# Altium footprint library THU VIEN V1.PcbLib: 400 footprints (part 25 of 25)
Each footprint in its own frame and in the unit in brackets; x right, y up, seen from the top. Pads: shape width x height; smd on the part's side, far side on the other; paste and mask are expansions set on the pad; w line width, h text height; cw(c..) or ccw(c..) is an arc to the next point about the centre after c.
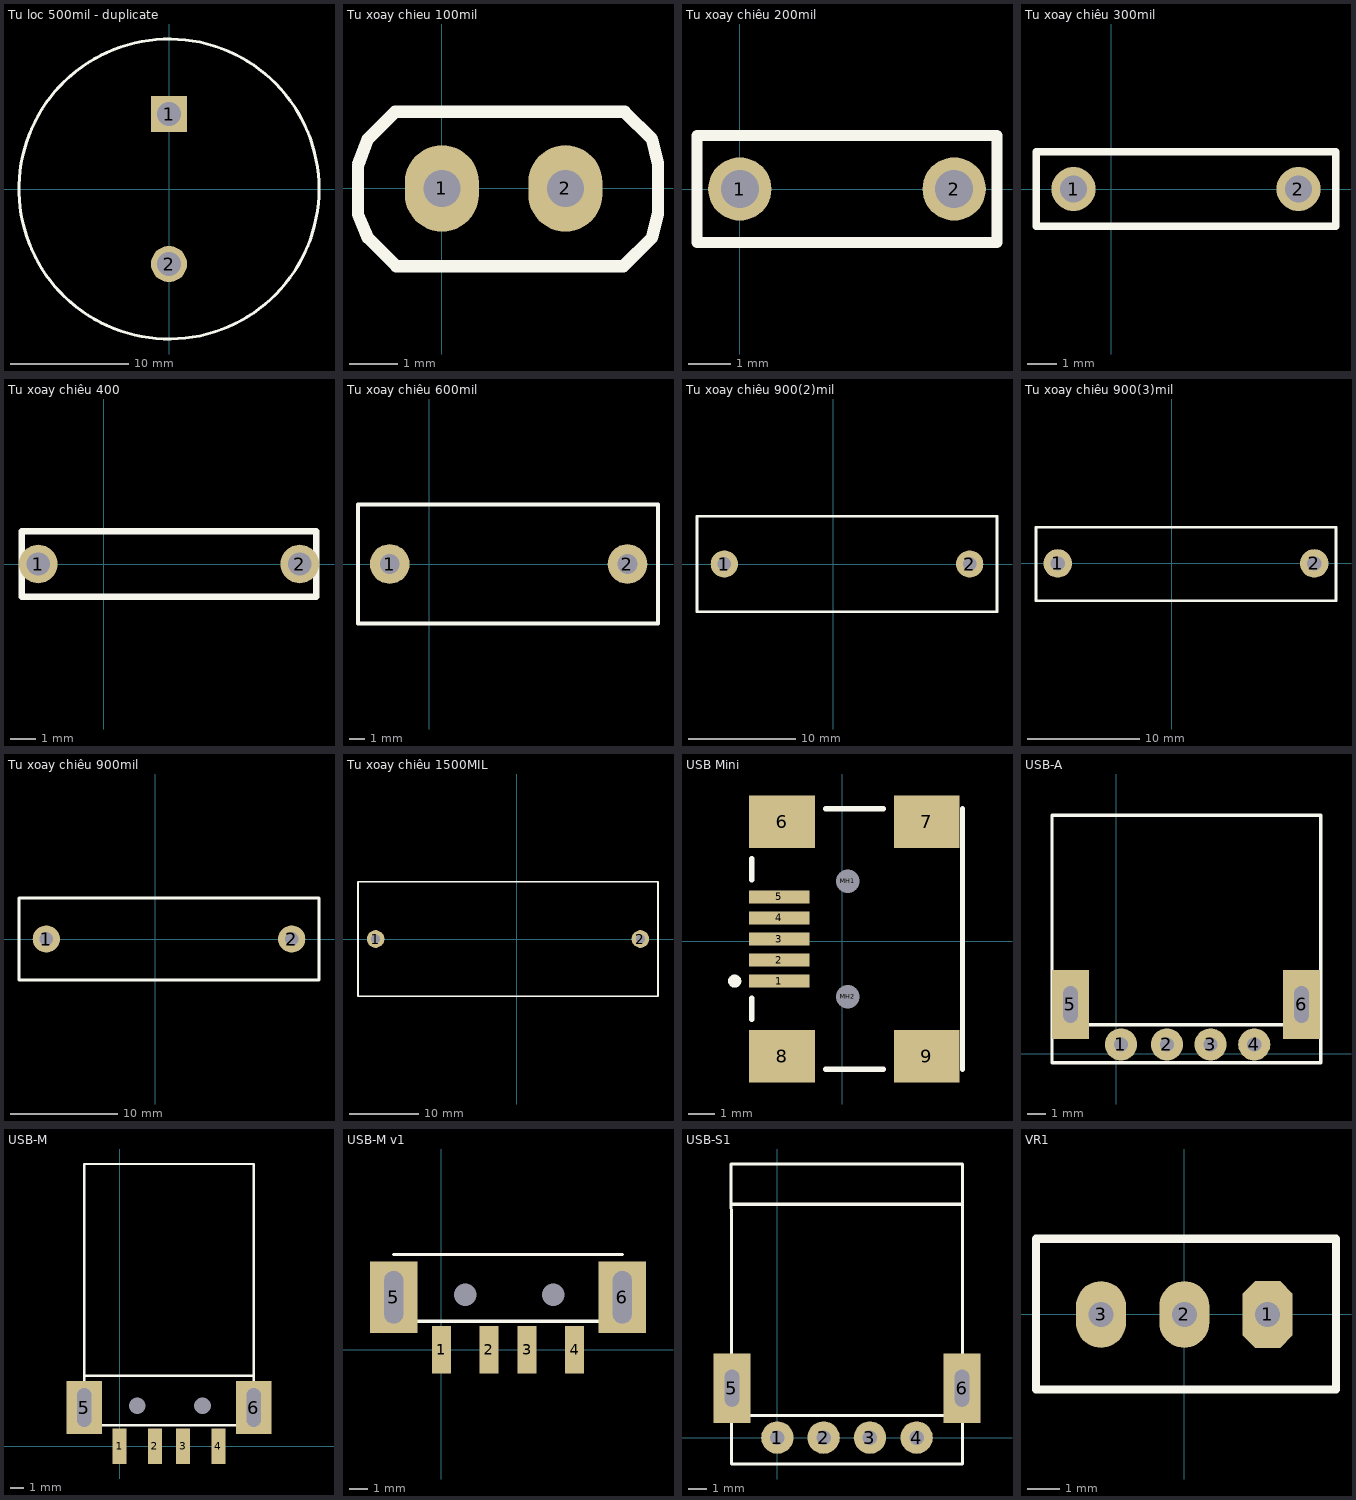
[diagram p24: the footprints below, top view; thin cyan lines are the x and y axes]

## Tu loc 500mil - duplicate [mil]
pads (2):
  rect 120x120 hole 80: 1(0,250)
  round 120 hole 80: 2(0,-250)
Top Overlay:
  circle w10: c0,0 r500
3D body: height 1996.38, standoff -113.86, extent -492.12,-492.12 492.12,492.13

## Tu xoay chieu 100mil [mil]
pads (2):
  oval 60x70 hole 30: 1(0,0) 2(100,0)
Top Overlay:
  lines w10: -68,-21 -68,19 -60,40 -38,62 148,62 170,40 175,20 175,-20 170,-40 147,-63 -37,-63 -60,-40 -68,-21
3D body: height 530, standoff -414.8, extent -66.79,-62.5 166.87,62.5

## Tu xoay chiêu 200mil [mm]
pads (2):
  round 1.5 hole 0.9: 1(0,0) 2(5.08,0)
Top Overlay:
  lines w0.254: -1.016,-1.27 1.778,-1.27 6.096,-1.27 6.096,-0.711 6.096,1.27 -1.016,1.27 -1.016,-1.27
3D body: height 7.62, standoff 0, extent -0.254,-1.143 5.334,1.143

## Tu xoay chiêu 300mil [mm]
pads (2):
  round 1.5 hole 0.9: 1(-1.27,0) 2(6.35,0)
Top Overlay:
  lines w0.254: -2.54,-1.27 1.778,-1.27 7.62,-1.27 7.62,1.27 -2.54,1.27 -2.54,-1.27
3D body: height 8.61, standoff -4.57, extent -1.46,-1.198 6.541,1.195

## Tu xoay chiêu 400 [mm]
pads (2):
  round 1.5 hole 0.9: 1(-2.54,0) 2(7.62,0)
Top Overlay:
  lines w0.254: -3.175,-1.27 -3.175,1.27 8.255,1.27 8.255,-1.27 1.778,-1.27 -3.175,-1.27
3D body: height 8.61, standoff -4.57, extent -1.46,-1.198 6.541,1.195

## Tu xoay chiêu 600mil [mm]
pads (2):
  round 2.54 hole 1.27: 1(-2.54,0) 2(12.7,0)
Top Overlay:
  lines w0.254: -4.572,-3.81 -0.762,-3.81 14.656,-3.81 14.656,3.81 -4.572,3.81 -4.572,-3.81
3D body: height 13.5, standoff -17.5, extent -3.92,-3.75 14.08,3.75

## Tu xoay chiêu 900(2)mil [mm]
pads (2):
  round 2.54 hole 1.27: 1(-10.16,0) 2(12.7,0)
Top Overlay:
  lines w0.254: -12.7,-4.445 -0.127,-4.445 15.24,-4.445 15.24,4.445 -12.7,4.445 -12.7,-4.445
3D body: height 20.5, standoff -3, extent -11.755,-4.574 14.245,4.726

## Tu xoay chiêu 900(3)mil [mm]
pads (2):
  round 2.54 hole 1.27: 1(-10.16,0) 2(12.7,0)
Top Overlay:
  lines w0.254: -12.09,-3.327 -0.381,-3.327 14.63,-3.327 14.63,3.226 -12.09,3.226 -12.09,-3.327
3D body: height 16, standoff -2, extent -11.654,-3.061 14.346,2.949

## Tu xoay chiêu 900mil [mm]
pads (2):
  round 2.54 hole 1.27: 1(-10.16,0) 2(12.7,0)
Top Overlay:
  lines w0.254: -12.7,-3.81 -12.7,3.81 15.24,3.81 15.24,-3.81 -0.762,-3.81 -12.7,-3.81
3D body: height 19, standoff -3, extent -11.73,-3.9 14.27,3.9

## Tu xoay chiêu 1500MIL [mm]
pads (2):
  round 2.54 hole 1.27: 1(-20.32,0) 2(17.78,0)
Top Overlay:
  lines w0.254: -22.86,-8.255 -3.937,-8.255 20.32,-8.255 20.32,8.255 -22.86,8.255 -22.86,-8.255
3D body: height 29, standoff -2.5, extent -21.995,-8.542 19.505,8.458

## USB Mini [mm] "Connector; USB Mini-B, Sinking Type, SM; 5 Position; Right Angle"
height 0.65
pads (11):
  rect 2.3x0.5 smd: 1(-2.389,-1.524) 2(-2.389,-0.724) 3(-2.389,0.076) 4(-2.389,0.876) 5(-2.389,1.676)
  rect 2.5x2 smd: 6(-2.289,4.526) 7(3.211,4.526) 8(-2.289,-4.374) 9(3.211,-4.374)
  round 0.6 hole 0.9 unplated: MH1(0.211,2.276) MH2(0.211,-2.124)
Top Overlay:
  circle w0.25: c-4.089,-1.524 r0.125
  lines w0.2: -3.439,-2.974 -3.439,-2.174 ; -3.439,2.326 -3.439,3.126 ; -0.639,-4.874 1.561,-4.874 ; -0.639,5.026 1.561,5.026 ; 4.572,-4.874 4.572,5.026
3D body: height 3.95, standoff -1, extent -3.097,-5.274 6.103,5.426

## USB-A [mil] "USB A connector, 4pin, For USB sing"
height 100
pads (6):
  round 70 hole 31: 1(10,20) 2(110,20) 3(205,20) 4(300,20)
  rect 80x150 hole 31 slot 80 at 90 deg: 5(-100,107) 6(403,107)
Top Overlay:
  lines w7: -103,63 396,63 ; -140,-20 445,-20 445,519 -140,519 -140,-20
3D body: height 273.62, standoff -165.35, extent -163.02,-19 459.02,520.37

## USB-M [mil] "For USB SMD"
height 150
pads (8):
  rect 40x100 smd: 1(0,0) 2(100,0) 3(180,0) 4(280,0)
  round 0 hole 47.24: 2(50,115) 2(235,115)
  rect 100x150 hole 40 slot 110 at 90 deg: 5(-100,110) 6(380,110)
Top Overlay:
  lines w7: -100,200 380,200 ; -100,60 380,60 380,800 -100,800 -100,60
3D body: height 85.83, standoff -138.58, extent -105.32,-5.91 386.81,809.05

## USB-M v1 [mil] "For USB SMD"
height 150
pads (8):
  rect 40x100 smd: 1(0,0) 2(100,0) 3(180,0) 4(280,0)
  round 0 hole 47.24: 2(50,115) 2(235,115)
  rect 100x150 hole 40 slot 110 at 90 deg: 5(-100,110) 6(380,110)
Top Overlay:
  lines w7: -100,60 380,60 ; -100,200 380,200
3D body: height 85.83, standoff -138.58, extent -105.32,-5.91 386.81,809.05

## USB-S1 [mil] "USB A connector, 4pin, For USB sing"
height 100
pads (6):
  round 70 hole 31: 1(0,0) 2(100,0) 3(200,0) 4(301,0)
  rect 80x150 hole 31 slot 80 at 90 deg: 5(-98,107) 6(399,107)
Top Overlay:
  lines w7: -99,504 400,504 ; -98,48 401,48 ; -100,591 -99,397 -99,-57 400,-57 400,591 -100,591

## VR1 [mil]
pads (3):
  oct 60x80 hole 30: 1(100,0)
  oval 60x80 hole 30: 2(0,0) 3(-100,0)
Top Overlay:
  lines w10: 182,89 180,91 -178,91 -178,-90 182,-90 182,91
3D body: height 454.25, standoff -234.73, extent -181,-93.49 181.2,95.49